# Altium footprint library Tomra_Cadstar_Footprints.PcbLib: 380 footprints (part 23 of 24)
Each footprint in its own frame and in the unit in brackets; x right, y up, seen from the top. Pads: shape width x height; smd on the part's side, far side on the other; paste and mask are expansions set on the pad; w line width, h text height; cw(c..) or ccw(c..) is an arc to the next point about the centre after c.
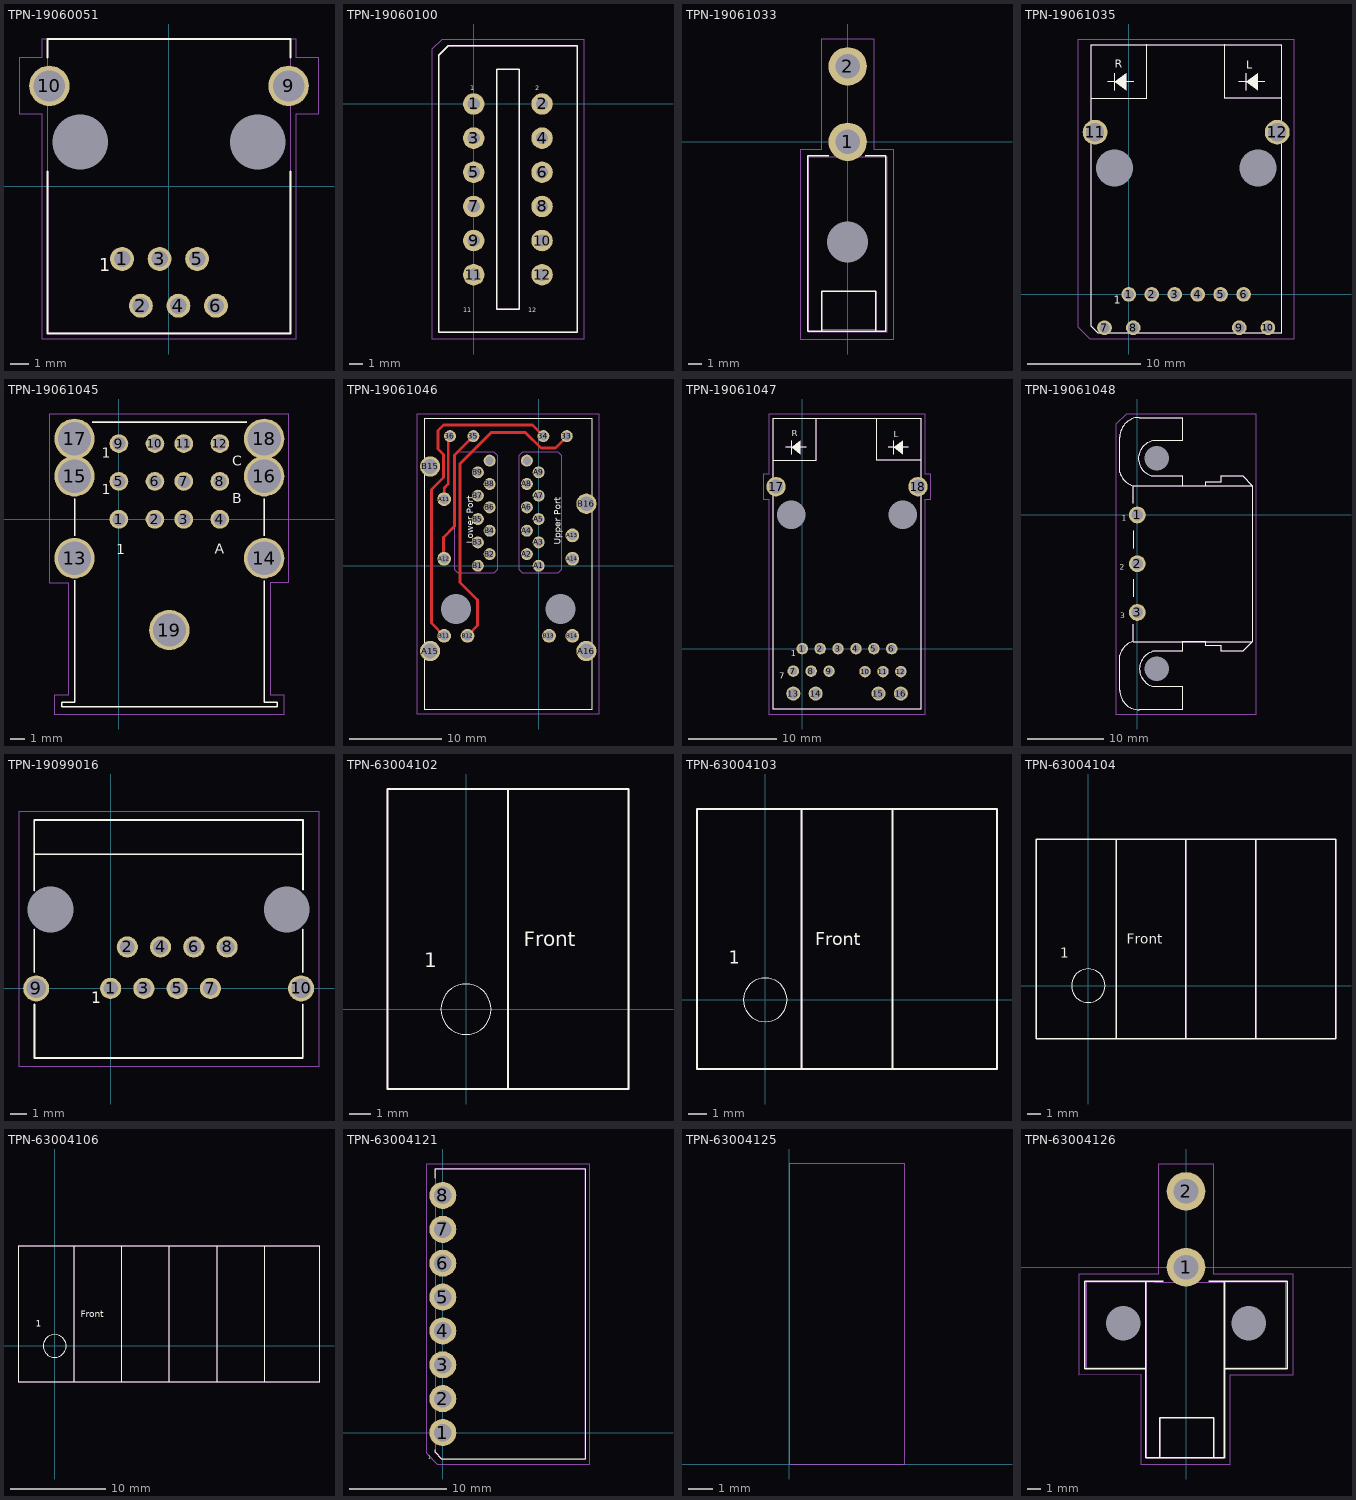
[diagram p22: the footprints below, top view; thin cyan lines are the x and y axes]

## TPN-19060051 [mm]
height 12.5
pads (10):
  round 1.3 / inner round 1.524 / far side round 1.3 hole 0.9 paste+0 mask+0: 1(-2.55,-3.95) 2(-1.53,-6.49) 3(-0.51,-3.95) 4(0.51,-6.49) 5(1.53,-3.95) 6(2.55,-6.49)
  round 0 / inner round 1.524 / far side round 0 hole 3 unplated paste+0 mask+0: 7(4.825,2.4) 8(-4.825,2.4)
  round 2.2 / inner round 1.524 / far side round 2.2 hole 1.7 paste+0 mask+0: 9(6.5,5.45) 10(-6.5,5.45)
Top Silk:
  lines w0.1: -6.6,0.8 -6.6,-8 6.6,-8 6.6,0.8 ; -6.6,7 -6.6,8 6.6,8 6.6,7
  text "1" at -3.795,-4.615 h0.7
  text ".Designator" at -6.6,8 h0.7
Top Assembly:
  lines w0.05: -6.6,0.8 -6.6,-8 ; 6.6,0.8 6.6,-8 ; -6.6,-8 6.6,-8 ; -6.6,-8 6.6,-8 ; -6.6,-8 -6.6,8 6.6,8 6.6,-8
Top Placement:
  lines w0.01: -8.1,3.9 -6.9,3.9 -6.9,-8.3 6.9,-8.3 6.9,3.9 8.1,3.9 8.1,7 6.9,7 6.9,8 -6.9,8 -6.9,7 -8.1,7 -8.1,3.9

## TPN-19060100 [mm]
height 13.5
pads (12):
  round 1.6 / inner round 1.524 / far side round 1.6 hole 0.9 paste+0 mask+0: 1(0,0) 2(5.08,0) 3(0,-2.54) 4(5.08,-2.54) 5(0,-5.08) 6(5.08,-5.08) 7(0,-7.62) 8(5.08,-7.62) 9(0,-10.16) 10(5.08,-10.16) 11(0,-12.7) 12(5.08,-12.7)
Top Silk:
  lines w0.1: -2.6,-16.979 7.7,-16.979 7.7,4.33 -1.9,4.33 -2.6,3.63 -2.6,-16.979 ; 1.7,-15.27 3.4,-15.27 3.4,2.58 1.7,2.58 1.7,-15.27
  text "1" at -0.254,1.016 h0.35
  text "2" at 4.572,1.016 h0.35
  text "12" at 4.064,-15.494 h0.35
  text "11" at -0.762,-15.494 h0.35
  text ".Designator" at 0,0.5 h0.7
Top Assembly:
  lines w0.05: -2.6,-16.979 7.7,-16.979 7.7,4.33 -1.9,4.33 -2.6,3.63 -2.6,-16.979 ; 1.7,-15.27 3.4,-15.27 3.4,2.58 1.7,2.58 1.7,-15.27
Top Placement:
  lines w0.01: -3.1,-17.479 8.2,-17.479 8.2,4.83 -2.332,4.83 -3.1,4.097 -3.1,-17.479

## TPN-19061033 [mm]
height 10
pads (3):
  round 2.8 / inner round 1.524 / far side round 2.8 hole 1.8 paste+0 mask+0: 1(0,0) 2(0,5.512)
  round 0 / inner round 1.524 / far side round 0 hole 3 unplated paste+0 mask+0: 3(0,-7.3)
Top Silk:
  lines w0.1: -1.397,-1.016 -2.921,-1.016 -2.921,-13.843 -1.905,-13.843 ; 1.27,-1.016 2.794,-1.016 2.794,-13.843 -1.905,-13.843 ; 2.032,-13.843 2.032,-10.922 -1.905,-10.922 -1.905,-13.843
  text ".Designator" at 0,0 h0.7
Top Assembly:
  lines w0.05: 2.032,-13.716 2.032,-10.922 ; 2.032,-13.716 -1.905,-13.716 -1.905,-10.922 2.032,-10.922 ; 2.032,-13.716 2.032,-10.922 ; -2.845,-13.894 2.845,-13.894 2.845,-1.1 -2.845,-1.1 -2.845,-13.894
Top Placement:
  lines w0.01: -3.445,-14.394 -3.445,-0.592 -1.945,-0.592 -1.945,7.508 1.955,7.508 1.955,-0.592 3.345,-0.592 3.345,-14.394 -3.445,-14.394

## TPN-19061035 [mm]
height 13.41
pads (14):
  round 1.3 / inner round 1.524 / far side round 1.3 hole 0.9 paste+0 mask+0: 1(0,0) 2(2.032,0) 3(4.064,0) 4(6.096,0) 5(8.128,0) 6(10.16,0) 7(-2.15,-2.95) 8(0.39,-2.95) 9(9.77,-2.95) 10(12.31,-2.95)
  round 2.2 / inner round 1.524 / far side round 2.2 hole 1.6 paste+0 mask+0: 11(-2.98,14.35) 12(13.14,14.35)
  round 0 / inner round 1.524 / far side round 0 hole 3.25 unplated paste+0 mask+0: 13(-1.27,11.18) 14(11.43,11.18)
Top Silk:
  region: -1.22,18.812 -0.204,19.574 -0.204,18.05
  region: 10.38,18.812 11.396,19.574 11.396,18.05
  lines w0.1: -3.32,17.35 1.58,17.35 1.58,22.126 ; -1.855,18.812 0.431,18.812 ; -1.22,18.05 -1.22,19.574 ; 8.48,22.126 8.48,17.35 13.48,17.35 ; 9.745,18.812 12.031,18.812 ; 10.38,18.05 10.38,19.574 ; -3.32,-2.83 -2.72,-3.43 13.48,-3.43 13.48,22.1 -3.32,22.1 -3.32,-2.83
  text "1" at -1.32,-0.85 h0.7
  text "R" at -1.22,20.05 h0.7
  text "L" at 10.38,19.95 h0.7
  text ".Designator" at 0,0 h0.7
Top Assembly:
  region: -1.22,18.812 -0.204,19.574 -0.204,18.05
  region: 10.38,18.812 11.396,19.574 11.396,18.05
  lines w0.05: -3.32,17.35 1.58,17.35 1.58,22.126 ; -1.855,18.812 0.431,18.812 ; -1.22,18.05 -1.22,19.574 ; 8.48,22.126 8.48,17.35 13.48,17.35 ; 9.745,18.812 12.031,18.812 ; 10.38,18.05 10.38,19.574 ; -3.32,-2.83 -2.72,-3.43 13.48,-3.43 13.48,22.1 -3.32,22.1 -3.32,-2.83
  text "R" at -1.22,20.05 h0.7
  text "L" at 10.38,19.95 h0.7
Top Placement:
  lines w0.01: -4.46,-2.908 -3.42,-3.948 14.59,-3.948 14.59,22.6 -4.46,22.6 -4.46,-2.908

## TPN-19061045 [mm]
height 24.8
pads (19):
  round 1.3 / inner round 1.524 / far side round 1.3 hole 0.9 paste+0 mask+0: 1(0,0) 2(2.5,0) 3(4.5,0) 4(7,0) 5(0,2.625) 6(2.5,2.625) 7(4.5,2.625) 8(7,2.625) 9(0,5.25) 10(2.5,5.25) 11(4.5,5.25) 12(7,5.25)
  round 2.8 / inner round 1.524 / far side round 2.8 hole 2.3 paste+0 mask+0: 13(-3.075,-2.7) 14(10.075,-2.7) 15(-3.075,2.985) 16(10.075,2.985) 17(-3.075,5.58) 18(10.075,5.58) 19(3.5,-7.68)
Top Silk:
  lines w0.1: -3.075,-4.225 -3.075,-12.7 -3.975,-12.7 -3.975,-13 10.975,-13 10.975,-12.7 10.075,-12.7 10.075,-4.25 ; -3.075,-1.15 -3.075,1.425 ; -1.85,6.725 8.85,6.725 ; 10.075,-1.15 10.075,1.425
  text "C" at 7.875,3.7 h0.7
  text "1" at -0.175,-2.425 h0.7
  text "B" at 7.875,1.1 h0.7
  text "1" at -1.2,1.75 h0.7
  text "A" at 6.65,-2.4 h0.7
  text "1" at -1.2,4.275 h0.7
  text ".Designator" at 0,0 h0.7
Top Assembly:
  lines w0.05: -3.075,-4.225 -3.075,-12.7 -3.975,-12.7 -3.975,-13 10.975,-13 10.975,-12.7 10.075,-12.7 10.075,-4.25 ; -3.075,-1.1 -3.075,1.475 ; -1.85,6.775 8.85,6.775 ; 10.075,-1.1 10.075,1.475
  text "USB A" at 0.55,-5.375 h0.35
Top Placement:
  lines w0.01: -4.825,-4.4 -4.825,7.3 11.775,7.3 11.775,-4.35 10.525,-4.35 10.515,-12.2 11.475,-12.2 11.475,-13.5 -4.475,-13.5 -4.475,-12.2 -3.515,-12.2 -3.515,-4.4 -4.825,-4.4

## TPN-19061046 [mm]
height 25.8
pads (38):
  round 0 / inner round 1.524 / far side round 0 hole 3.25 unplated paste+0 mask+0: 21(-9.002,-4.7) 22(2.398,-4.7)
  round 1.3 / inner round 1.524 / far side round 1.3 hole 0.9 paste+0 mask+0: 33(3.063,14.096) 34(0.523,14.096) 35(-7.097,14.096) 36(-9.637,14.096) A1(0,0) A2(-1.27,1.27) A3(0,2.54) A4(-1.27,3.81) A5(0,5.08) A6(-1.27,6.35) A7(0,7.62) A8(-1.27,8.89) A9(0,10.16) A10(-1.27,11.43) B1(-6.604,0) B2(-5.334,1.27) B3(-6.604,2.54) B4(-5.334,3.81) B5(-6.604,5.08) B6(-5.334,6.35) B7(-6.604,7.62) B8(-5.334,8.89) B9(-6.604,10.16) B10(-5.334,11.43)
  round 1.5 / inner round 1.524 / far side round 1.5 hole 1 paste+0 mask+0: A11(-10.272,7.239) A12(-10.272,0.761) A13(3.668,3.301) A14(3.668,0.761) B11(-10.272,-7.621) B12(-7.732,-7.621) B13(1.128,-7.621) B14(3.668,-7.621)
  round 2.2 / inner round 1.524 / far side round 2.2 hole 1.6 paste+0 mask+0: A15(-11.802,-9.271) A16(5.198,-9.271) B15(-11.802,10.794) B16(5.198,6.744)
Top Elec:
  lines w0.3: -10.272,-7.621 -11.652,-6.206 -11.652,8.294 -10.352,9.594 -10.352,12.094 -10.952,12.694 -10.952,14.694 -10.352,15.294 -0.652,15.294 0.546,14.096 0.523,14.096 ; -10.272,0.761 -10.352,0.761 -10.352,3.094 -9.152,4.294 -9.152,12.041 -7.097,14.096 ; -10.272,7.239 -10.252,7.239 -10.252,8.481 -9.839,8.894 -9.839,13.894 -9.637,14.096 ; -7.732,-7.621 -6.652,-6.506 -6.652,-3.706 -8.552,-1.806 -8.552,11.094 -5.152,14.494 -1.452,14.494 0.248,12.794 1.848,12.794 3.15,14.096 3.063,14.096
Top Silk:
  lines w0.1: -12.457,-15.621 5.831,-15.621 5.831,16.002 -12.457,16.002 -12.457,-15.621
  text "Lower Port" at -7.123,2.413 h0.7
  text "Upper Port" at 2.402,2.286 h0.7
  text ".Designator" at 0,0 h0.7
Top Assembly:
  lines w0.05: -9.155,-0.381 -8.774,-0.762 -4.837,-0.762 -4.456,-0.381 -4.456,11.938 -4.837,12.319 -8.774,12.319 -9.155,11.938 -9.155,-0.381 ; -2.17,-0.381 -1.789,-0.762 2.148,-0.762 2.529,-0.381 2.529,11.938 2.148,12.319 -1.789,12.319 -2.17,11.938 -2.17,-0.381
Top Placement:
  lines w0.01: -13.252,-16.121 6.593,-16.121 6.593,16.502 -13.252,16.502 -13.252,-16.121

## TPN-19061047 [mm]
height 15.2
pads (20):
  round 1.3 / inner round 1.524 / far side round 1.3 hole 0.9 paste+0 mask+0: 1(0,0) 2(2.032,0) 3(4.064,0) 4(6.096,0) 5(8.128,0) 6(10.16,0) 7(-1.02,-2.55) 8(1.012,-2.55) 9(3.044,-2.55) 10(7.13,-2.6) 11(9.162,-2.6) 12(11.194,-2.6)
  round 1.6 / inner round 1.524 / far side round 1.6 hole 1.2 paste+0 mask+0: 13(-1.02,-5.1) 14(1.52,-5.1) 15(8.654,-5.1) 16(11.194,-5.1)
  round 2.2 / inner round 1.524 / far side round 2.2 hole 1.6 paste+0 mask+0: 17(-2.98,18.4) 18(13.14,18.4)
  round 0 / inner round 1.524 / far side round 0 hole 3.25 unplated paste+0 mask+0: 19(-1.27,15.23) 20(11.43,15.23)
Top Silk:
  region: -1.22,22.862 -0.204,23.624 -0.204,22.1
  region: 10.38,22.862 11.396,23.624 11.396,22.1
  lines w0.1: -3.32,21.4 1.58,21.4 1.58,26.176 ; -1.855,22.862 0.431,22.862 ; -1.22,22.1 -1.22,23.624 ; 8.48,26.176 8.48,21.4 13.48,21.4 ; 9.745,22.862 12.031,22.862 ; 10.38,22.1 10.38,23.624 ; -3.32,-6.9 13.48,-6.9 13.48,26.15 -3.32,26.15 -3.32,-6.9
  text "R" at -1.22,24.1 h0.7
  text "L" at 10.38,24 h0.7
  text "1" at -1.32,-0.85 h0.7
  text "7" at -2.62,-3.4 h0.7
  text ".Designator" at 0,0 h0.7
Top Assembly:
  region: -1.22,22.862 -0.204,23.624 -0.204,22.1
  region: 10.38,22.862 11.396,23.624 11.396,22.1
  lines w0.05: -3.32,21.4 1.58,21.4 1.58,26.176 ; -1.855,22.862 0.431,22.862 ; -1.22,22.1 -1.22,23.624 ; 8.48,26.176 8.48,21.4 13.48,21.4 ; 9.745,22.862 12.031,22.862 ; 10.38,22.1 10.38,23.624 ; -3.32,-6.9 13.48,-6.9 13.48,26.15 -3.32,26.15 -3.32,-6.9
  text "R" at -1.22,24.1 h0.7
  text "L" at 10.38,24 h0.7
Top Placement:
  lines w0.01: -4.42,16.985 -4.42,19.8 -3.825,19.8 -3.82,26.65 13.98,26.65 13.98,19.8 14.58,19.8 14.58,16.985 13.955,16.985 13.98,-7.418 -3.82,-7.418 -3.82,16.985 -4.42,16.985

## TPN-19061048 [mm]
height 9
pads (5):
  round 2.2 / inner round 1.524 / far side round 2.2 hole 1.5 paste+0 mask+0: 1(0,0) 2(0,-6.35) 3(0,-12.7)
  round 0 / inner round 1.524 / far side round 0 hole 3.2 unplated paste+0 mask+0: 4(2.54,-20.066) 5(2.54,7.366)
Top Silk:
  lines w0.1: -0.508,-14.224 -0.508,-16.51 ; -0.508,-10.668 -0.508,-8.382 ; -0.508,-4.318 -0.508,-2.032 ; -0.508,1.524 -0.508,3.81 ; -0.508,-16.51 14.986,-16.51 ; -0.508,-16.51 ccw(c0,-18.796) -2.286,-18.288 -2.286,-22.86 ccw(c0.254,-22.86) 0.254,-25.4 5.842,-25.4 5.842,-22.352 2.032,-22.352 cw(c2.646,-20.066) 2.032,-17.78 5.842,-17.78 5.842,-16.51 8.89,-16.51 8.89,-17.018 10.922,-17.018 10.922,-17.78 13.716,-17.78 14.986,-16.51 ; -0.508,3.81 14.986,3.81 ; -0.508,3.81 cw(c0,6.096) -2.286,5.588 -2.286,10.16 cw(c0.254,10.16) 0.254,12.7 5.842,12.7 5.842,9.652 2.032,9.652 ccw(c2.455,7.366) 2.032,5.08 5.842,5.08 5.842,3.81 8.89,3.81 8.89,4.318 10.922,4.318 10.922,5.08 13.716,5.08 14.986,3.81 ; 14.986,-16.51 14.986,3.81
  text "3" at -2.26,-13.49 h0.7
  text "1" at -2.032,-0.762 h0.7
  text "2" at -2.286,-7.112 h0.7
  text ".Designator" at 0,0 h0.7
Top Assembly:
  lines w0.05: -0.508,-14.224 -0.508,-16.51 ; -0.508,-10.668 -0.508,-8.382 ; -0.508,-4.318 -0.508,-2.032 ; -0.508,1.524 -0.508,3.81 ; -0.508,-16.51 14.986,-16.51 ; -0.508,-16.51 ccw(c0,-18.796) -2.286,-18.288 -2.286,-22.86 ccw(c0.254,-22.86) 0.254,-25.4 5.842,-25.4 5.842,-22.352 2.032,-22.352 cw(c2.646,-20.066) 2.032,-17.78 5.842,-17.78 5.842,-16.51 8.89,-16.51 8.89,-17.018 10.922,-17.018 10.922,-17.78 13.716,-17.78 14.986,-16.51 ; -0.508,3.81 14.986,3.81 ; -0.508,3.81 cw(c0,6.096) -2.286,5.588 -2.286,10.16 cw(c0.254,10.16) 0.254,12.7 5.842,12.7 5.842,9.652 2.032,9.652 ccw(c2.455,7.366) 2.032,5.08 5.842,5.08 5.842,3.81 8.89,3.81 8.89,4.318 10.922,4.318 10.922,5.08 13.716,5.08 14.986,3.81 ; 14.986,-16.51 14.986,3.81
  text "1" at -2.032,-0.762 h0.35
  text "2" at -2.286,-7.112 h0.35
  text "3" at -2.26,-13.49 h0.35
Top Placement:
  lines w0.01: -2.81,-25.94 15.49,-25.94 15.49,13.16 -1.46,13.16 -2.81,11.81 -2.81,-25.94
  text "1" at -2.032,-0.762 h0.35
  text "2" at -2.286,-7.112 h0.35
  text "3" at -2.26,-13.49 h0.35

## TPN-19099016 [mm]
height 14.75
pads (12):
  round 1.3 / inner round 1.524 / far side round 1.3 hole 0.9 paste+0 mask+0: 1(0,0) 2(1.02,2.54) 3(2.04,0) 4(3.06,2.54) 5(4.08,0) 6(5.1,2.54) 7(6.12,0) 8(7.14,2.54)
  round 1.6 / inner round 1.524 / far side round 1.6 hole 1.2 paste+0 mask+0: 9(-4.565,0) 10(11.685,0)
  round 0 / inner round 1.524 / far side round 0 hole 2.8 unplated paste+0 mask+0: 11(-3.69,4.84) 12(10.81,4.84)
Top Silk:
  lines w0.1: -4.68,0.98 -4.68,3.63 ; -4.68,5.99 -4.68,10.33 11.8,10.33 11.8,6.04 ; -4.67,-0.98 -4.67,-4.27 11.79,-4.27 11.79,-0.98 ; -4.66,8.22 11.79,8.22 ; 11.79,0.98 11.79,3.63
  text "1" at -1.18,-0.91 h0.7
  text ".Designator" at 0,0 h0.7
Top Assembly:
  lines w0.05: -4.68,0.98 -4.68,3.63 ; -4.68,5.99 -4.68,10.33 11.8,10.33 11.8,6.04 ; -4.67,-0.98 -4.67,-4.27 11.79,-4.27 11.79,-0.98 ; -4.66,8.22 11.79,8.22 ; 11.79,0.98 11.79,3.63
  text "1" at -1.18,-0.91 h0.7
Top Placement:
  lines w0.01: -5.62,-4.77 12.78,-4.77 12.78,10.83 -5.62,10.83 -5.62,-4.77

## TPN-63004102 [mm]
height 13
Top Silk:
  lines w0.01: 0,-1.2 cw(c0,0) 0,1.2 cw(c0,0) 0,-1.2
  lines w0.1: 2,-3.75 2,10.5 ; -3.75,-3.8 7.75,-3.8 7.75,10.5 -3.75,10.5 -3.75,-3.8
  text "Front" at 2.75,3 h0.7
  text "1" at -2,2 h0.7
  text ".Designator" at 0,0 h0.7
Top Assembly:
  lines w0.05: 2,-3.75 2,10.5 ; -3.75,-3.8 7.75,-3.8 7.75,10.5 -3.75,10.5 -3.75,-3.8
Top Placement:
  lines w0.01: -3.75,-3.8 7.75,-3.8 7.75,10.5 -3.75,10.5 -3.75,-3.8

## TPN-63004103 [mm]
height 13
Top Silk:
  lines w0.01: 0,-1.2 cw(c0,0) 0,1.2 cw(c0,0) 0,-1.2
  lines w0.1: 2,-3.75 2,10.5 ; 7,-3.75 7,10.5 ; -3.75,-3.8 12.75,-3.8 12.75,10.5 -3.75,10.5 -3.75,-3.8
  text "1" at -2,2 h0.7
  text "Front" at 2.75,3 h0.7
  text ".Designator" at 0,0 h0.7
Top Assembly:
  lines w0.05: 2,-3.75 2,10.5 ; 7,-3.75 7,10.5 ; -3.75,-3.8 12.75,-3.8 12.75,10.5 -3.75,10.5 -3.75,-3.8
Top Placement:
  lines w0.01: -3.75,-3.8 12.75,-3.8 12.75,10.5 -3.75,10.5 -3.75,-3.8

## TPN-63004104 [mm]
height 13
Top Silk:
  lines w0.01: 0,-1.2 cw(c0,0) 0,1.2 cw(c0,0) 0,-1.2
  lines w0.1: 2,-3.75 2,10.5 ; 7,-3.75 7,10.5 ; 12,-3.75 12,10.5 ; -3.75,-3.8 17.75,-3.8 17.75,10.5 -3.75,10.5 -3.75,-3.8
  text "Front" at 2.75,3 h0.7
  text "1" at -2,2 h0.7
  text ".Designator" at 0,0 h0.7
Top Assembly:
  lines w0.05: 2,-3.75 2,10.5 ; 7,-3.75 7,10.5 ; 12,-3.75 12,10.5 ; -3.75,-3.8 17.75,-3.8 17.75,10.5 -3.75,10.5 -3.75,-3.8
Top Placement:
  lines w0.01: -3.75,-3.8 17.75,-3.8 17.75,10.5 -3.75,10.5 -3.75,-3.8

## TPN-63004106 [mm]
height 13
Top Silk:
  lines w0.01: 0,-1.2 cw(c0,0) 0,1.2 cw(c0,0) 0,-1.2
  lines w0.1: 2,-3.75 2,10.5 ; 7,-3.75 7,10.5 ; 12,-3.75 12,10.5 ; 17,-3.75 17,10.5 ; 22,-3.75 22,10.5 ; -3.75,-3.8 27.75,-3.8 27.75,10.5 -3.75,10.5 -3.75,-3.8
  text "Front" at 2.75,3 h0.7
  text "1" at -2,2 h0.7
  text ".Designator" at 0,0 h0.7
Top Assembly:
  lines w0.05: 2,-3.75 2,10.5 ; 7,-3.75 7,10.5 ; 12,-3.75 12,10.5 ; 17,-3.75 17,10.5 ; 22,-3.75 22,10.5 ; -3.75,-3.8 27.75,-3.8 27.75,10.5 -3.75,10.5 -3.75,-3.8
Top Placement:
  lines w0.01: -3.75,-3.8 27.75,-3.8 27.75,10.5 -3.75,10.5 -3.75,-3.8

## TPN-63004121 [mm]
height 12.4
pads (8):
  round 2.8 / inner round 1.524 / far side round 2.8 hole 1.8 paste+0 mask+0: 1(0,0) 2(0,3.5) 3(0,7) 4(0,10.5) 5(0,14) 6(0,17.5) 7(0,21) 8(0,24.5)
Top Silk:
  lines w0.1: -0.8,-1.8 -0.8,-2.05 -0.1,-2.75 14.7,-2.75 14.7,27.25 -0.8,27.25 -0.8,26.3
  text "1" at -1.5,-2.75 h0.35
  text ".Designator" at 0,0 h0.7
Top Assembly:
  lines w0.05: -0.8,-2 -0.05,-2.75 14.7,-2.75 14.7,27.25 -0.8,27.25 -0.8,-2
Top Placement:
  lines w0.01: -1.725,-2.1 -0.575,-3.25 15.2,-3.25 15.2,27.75 -1.725,27.75 -1.725,-2.1

## TPN-63004125 [mm]
height 11
Top Silk:
  text ".Designator" at 0,0 h0.7
Top Placement:
  lines w0.01: 0,0 4.7,0 4.7,12.16 0,12.16 0,0

## TPN-63004126 [mm]
pads (4):
  round 2.8 / inner round 1.524 / far side round 2.8 hole 1.8 paste+0 mask+0: 1(0,0) 2(0,5.512)
  round 0 / inner round 1.524 / far side round 0 hole 2.5 unplated paste+0 mask+0: 3(-4.572,-4.064) 4(4.572,-4.064)
Top Silk:
  lines w0.1: -2.921,-1.016 -2.921,-7.366 ; -1.905,-13.843 -1.905,-10.922 2.032,-10.922 2.032,-13.843 ; -1.651,-1.016 -7.366,-1.016 -7.366,-7.366 -2.921,-7.366 ; 1.651,-1.016 7.366,-1.016 7.366,-7.366 2.794,-7.366 ; 2.794,-1.016 2.794,-7.366 ; -2.921,-7.366 -2.921,-13.843 2.794,-13.843 2.794,-7.366
  text ".Designator" at 0,0 h0.7
Top Assembly:
  lines w0.05: -2.845,-7.29 -7.239,-7.29 -7.239,-1.092 -2.286,-1.092 2.845,-1.092 2.845,-13.894 -2.845,-13.894 -2.845,-1.092 ; -1.905,-13.716 -1.905,-10.922 2.032,-10.922 2.032,-13.843 ; 2.286,-1.092 7.264,-1.092 7.264,-7.29 2.819,-7.29
Top Placement:
  lines w0.01: -7.8,-7.8 -7.8,-0.5 -2,-0.5 -2,7.5 2,7.5 2,-0.5 7.8,-0.5 7.8,-7.8 3.2,-7.8 3.2,-14.3 -3.3,-14.3 -3.3,-7.796 -7.8,-7.8